# Altium footprint library Amirreza.PcbLib: 524 footprints (part 25 of 33)
Each footprint in its own frame and in the unit in brackets; x right, y up, seen from the top. Pads: shape width x height; smd on the part's side, far side on the other; paste and mask are expansions set on the pad; w line width, h text height; cw(c..) or ccw(c..) is an arc to the next point about the centre after c.
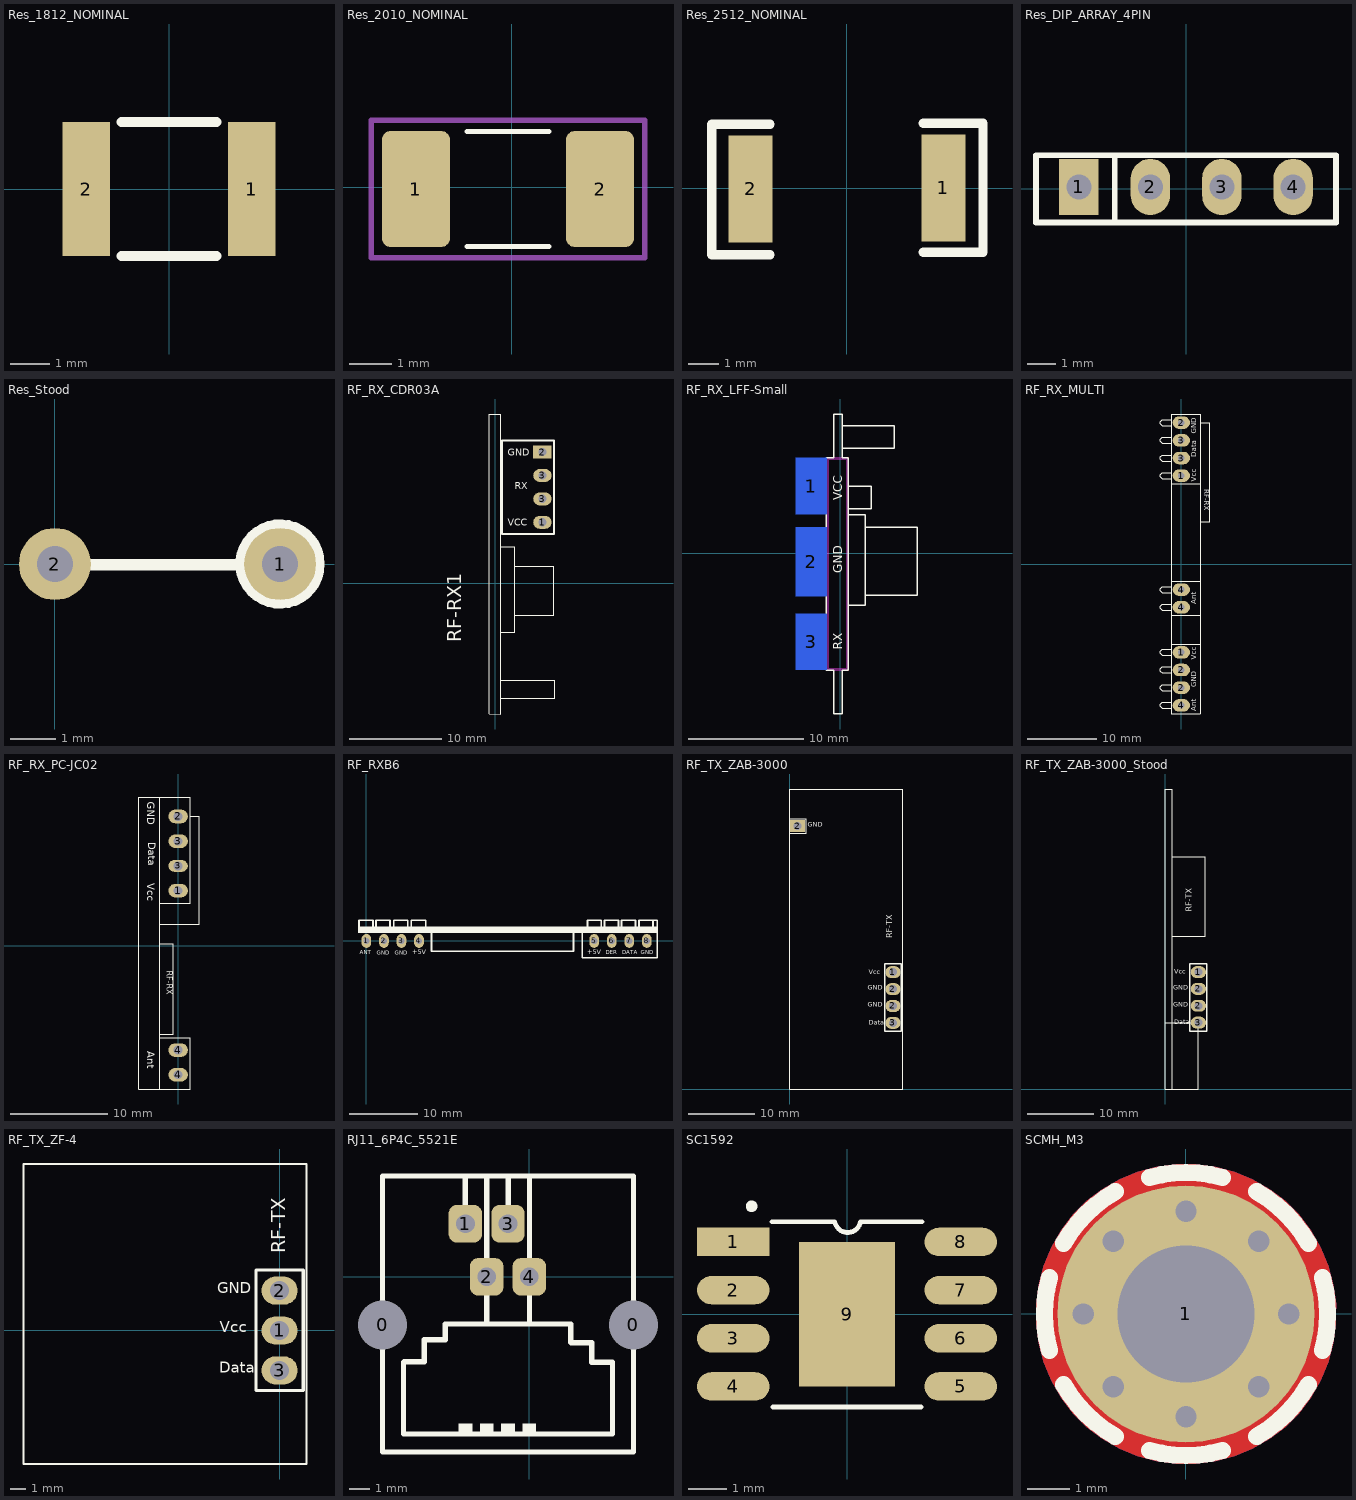
[diagram p24: the footprints below, top view; thin cyan lines are the x and y axes]

## Res_1812_NOMINAL [mm]
pads (2):
  rect 1.2x3.4 smd: 1(2.1,0) 2(-2.1,0)
Top Overlay:
  lines w0.25: -1.2,-1.7 1.2,-1.7 ; -1.2,1.7 1.2,1.7

## Res_2010_NOMINAL [mm]
pads (2):
  rrect25% 1.6x2.72 smd: 1(-2.252,-0.041) 2(2.068,-0.041)
Top Overlay:
  lines w0.127: -1.049,-1.391 0.866,-1.391 ; -1.05,1.309 0.865,1.309
Mechanical 13:
  lines w0.127: -3.302,-1.651 -3.302,1.569 3.118,1.569 3.118,-1.651 -3.302,-1.651
Mechanical 15:
  lines w0.05: -3.302,-1.651 -3.302,1.569 3.118,1.569 3.118,-1.651 -3.302,-1.651
3D body "User Library-R_2010.STEP": height 0.6, standoff 0, extent -2.605,-1.292 2.395,1.208

## Res_2512_NOMINAL [mm]
pads (2):
  rect 1.45x3.5 smd: 1(3.152,0.017) 2(-3.152,-0.017)
Top Overlay:
  lines w0.305: -2.517,-2.167 -4.422,-2.167 -4.422,2.1 -2.517,2.1 ; 2.487,-2.091 4.446,-2.091 4.446,2.125 2.487,2.125
3D body "User Library-res2512_body.step": height 0.64, standoff 0.02, extent -3.159,-1.6 3.16,1.6

## Res_DIP_ARRAY_4PIN [mm]
pads (4):
  rect 1.4x2 hole 0.889: 1(-3.808,0.075)
  oval 1.4x2 hole 0.889: 2(-1.268,0.075) 3(1.272,0.075) 4(3.812,0.075)
Top Overlay:
  lines w0.2: -5.334,-1.195 -5.334,1.194 5.334,1.194 ; -5.334,-1.194 5.334,-1.194 ; -2.54,-1.195 -2.54,1.194 ; 5.334,-1.195 5.334,1.143
3D body "4604x-101-103lf.stp": height 4.25, standoff -4.14, extent -5.055,-1.245 5.055,1.245

## Res_Stood [mm]
pads (2):
  round 1.6 hole 0.8: 1(5.004,0) 2(0,0)
Top Overlay:
  circle w0.254: c5.004,0 r0.866
  lines w0.254: 0.597,-0.018 4.052,-0.018

## RF_RX_CDR03A [mm]
pads (4):
  oval 2x1.4 hole 0.9: 1(5.122,6.622) 3(5.122,9.162) 3(5.122,11.702)
  rect 2x1.4 hole 0.9: 2(5.122,14.242)
Top Overlay:
  lines w0.127: 0.618,-12.439 6.477,-12.439 6.477,-10.502 0.663,-10.502 ; 2.092,1.829 6.325,1.829 6.325,-3.454 2.101,-3.454 ; -0.672,-14.173 0.593,-14.173 0.593,-3.955 0.593,14.536 0.593,18.372 -0.672,18.372 -0.672,-14.173 ; 0.592,-5.309 0.592,3.962 2.092,3.962 2.092,-5.309 0.592,-5.309
  lines w0.2: 6.35,15.512 0.72,15.512 0.72,5.352 6.375,5.352 ; 6.392,5.352 6.392,15.512
  text "RX" at 2.134,10.185 h0.76
  text "GND" at 1.372,13.868 h0.76
  text "VCC" at 1.346,6.248 h0.76
  text "RF-RX1" at -3.708,-6.401 h1.52

## RF_RX_LFF-Small [mm]
pads (3):
  rect 2.7x4.9 smd far side: 1(-2.54,5.842) 3(-2.54,-7.747)
  rect 2.7x6 smd far side: 2(-2.54,-0.762)
Top Overlay:
  lines w0.127: -1.033,8.288 -0.55,8.288 ; -0.042,12.123 0.187,12.123 ; 0.187,9.144 4.699,9.144 4.699,11.08 0.231,11.08 ; 0.695,3.868 2.701,3.868 2.701,5.804 0.739,5.804 ; 2.193,2.243 6.731,2.243 6.731,-3.683 2.202,-3.683 ; -0.55,8.288 -0.55,12.123 0.187,12.123 ; -0.55,8.288 -1.206,8.288 -1.206,-10.203 -0.55,-10.203 -0.55,-14.039 0.187,-14.039 0.187,-10.203 0.695,-10.203 0.695,8.288 ; 0.187,8.288 0.695,8.288 ; 0.187,8.288 0.187,12.123 ; 0.187,8.288 0.695,8.288 ; 0.693,-4.572 2.193,-4.572 2.193,3.334 0.693,3.334 0.693,-4.572
  text "VCC" at 0.178,4.597 h0.76
  text "GND" at 0.178,-1.753 h0.76
  text "RX" at 0.178,-8.433 h0.76
Keep-Out Layer:
  lines w0.254: -1.104,-10.167 -1.104,8.253 0.623,8.253 0.623,-10.167 -1.104,-10.167

## RF_RX_MULTI [mm] "315Mhz Reciever"
pads (10):
  oval 2.5x1.8 hole 0.9 mask+0: 1(0,-12.7) 1(0,12.7) 2(0,-17.78) 2(0,-15.24) 2(0,20.32) 3(0,15.24) 3(0,17.78) 4(0,-20.32) 4(0,-6.22) 4(0,-3.68)
Top Overlay:
  lines w0.127: -1.422,-20.752 -2.711,-20.752 -2.995,-20.467 -2.995,-20.173 -2.711,-19.888 -1.422,-19.886 ; -1.422,-18.212 -2.711,-18.212 -2.995,-17.928 -2.995,-17.633 -2.711,-17.348 -1.422,-17.347 ; -1.422,-15.672 -2.711,-15.672 -2.995,-15.388 -2.995,-15.093 -2.711,-14.808 -1.422,-14.807 ; -1.422,-13.132 -2.711,-13.132 -2.995,-12.848 -2.995,-12.553 -2.711,-12.268 -1.422,-12.267 ; -1.422,-11.52 2.718,-11.52 ; -1.422,-7.4 2.718,-7.4 ; -1.422,-6.652 -2.711,-6.652 -2.995,-6.368 -2.995,-6.073 -2.711,-5.788 -1.422,-5.787 ; -1.422,-4.112 -2.711,-4.112 -2.995,-3.828 -2.995,-3.533 -2.711,-3.248 -1.422,-3.247 ; -1.422,-2.5 2.718,-2.5 ; -1.422,11.52 2.718,11.52 ; -1.422,12.268 -2.711,12.268 -2.995,12.553 -2.995,12.847 -2.711,13.132 -1.422,13.134 ; -1.422,14.808 -2.711,14.808 -2.995,15.093 -2.995,15.387 -2.711,15.672 -1.422,15.674 ; -1.422,17.348 -2.711,17.348 -2.995,17.633 -2.995,17.927 -2.711,18.212 -1.422,18.214 ; -1.422,19.888 -2.711,19.888 -2.995,20.172 -2.995,20.467 -2.711,20.752 -1.422,20.753 ; 2.718,6.1 4.123,6.1 4.123,20.32 2.718,20.32 ; -1.422,-21.5 -1.422,21.5 2.718,21.5 2.718,-21.5 -1.422,-21.5
  text "Ant" at 2.47,-21.209 h1.3
  text "GND" at 2.464,-17.729 h1.3
  text "Vcc" at 2.465,-13.741 h1.3
  text "Ant" at 2.47,-5.816 h1.3
  text "Data" at 2.465,15.342 h1.3
  text "GND" at 2.464,18.745 h1.3
  text "RF-RX" at 3.048,10.77 h1.3
  text "Vcc" at 2.465,11.811 h1.3
3D body "User Library-RF receviver.STEP": height 14.85, standoff -1.55, extent -1.323,-22.86 4.928,22.86

## RF_RX_PC-JC02 [mm] "315Mhz Reciever"
pads (6):
  oval 2x1.4 hole 0.9: 1(0,5.65) 2(0,13.27) 3(0,10.73) 4(0,-13.27) 4(0,-10.73)
  oval 2x1.2 hole 0.9: 3(0,8.19)
Top Overlay:
  lines w0.127: -4.064,-14.73 -4.064,15.27 -1.905,15.27 1.27,15.27 1.27,4.38 -1.905,4.38 ; -4.048,-14.73 1.27,-14.73 1.27,-9.46 -1.905,-9.46 ; -1.905,-14.721 -1.905,15.251 ; -1.905,-9.082 -0.5,-9.082 -0.5,0.189 -1.905,0.189 ; -1.905,2.221 2.19,2.221 2.19,13.27 1.27,13.27
  text "Ant" at -3.429,-10.86 h1.3
  text "Vcc" at -3.429,6.412 h1.3
  text "GND" at -3.429,14.794 h1.3
  text "Data" at -3.302,10.603 h1.3
  text "RF-RX" at -1.397,-2.605 h1
3D body "User Library-pc-jc02RA.STEP": height 12, standoff -5.68, extent -4.349,-15.344 2.571,14.656

## RF_RXB6 [mm]
pads (8):
  oval 1.4x2 hole 0.9: 1(0,0) 2(2.54,0) 3(5.08,0) 4(7.62,0) 5(33.02,0) 6(35.56,0) 7(38.1,0) 8(40.64,0)
Top Overlay:
  rectangle: -1.219,1.168 42.266,2.057
  lines w0.254: -1.092,2.007 -1.092,2.997 0.94,2.997 ; 0.94,2.007 0.94,2.946 ; 1.397,1.905 1.397,2.997 3.429,2.997 3.429,1.88 ; 3.962,1.803 3.962,2.997 5.994,2.997 5.994,1.93 ; 6.502,1.372 6.502,2.997 8.585,2.997 8.585,1.422 ; 32.004,1.905 32.004,2.997 34.036,2.997 34.036,1.88 ; 32.029,1.727 32.029,2.997 33.02,2.997 ; 34.493,1.88 34.493,2.972 ; 34.493,2.997 36.525,2.997 ; 36.525,1.854 36.525,2.972 ; 36.982,1.905 36.982,2.997 39.014,2.997 39.014,1.88 ; 39.497,1.905 39.497,2.997 41.529,2.997 41.529,1.88 ; 41.504,2.997 42.164,2.997 42.164,1.321 ; 9.449,-1.499 9.449,1.346 30.023,1.346 30.023,-1.499 9.449,-1.499 ; 31.293,-2.438 31.293,1.422 42.164,1.422 42.164,-2.438 31.902,-2.438 31.293,-2.438
  text "GND" at 39.751,-2.134 h1
  text "DATA" at 37.059,-2.134 h1
  text "DER" at 34.671,-2.134 h1
  text "+5V" at 32.004,-2.21 h1.2
  text "+5V" at 6.655,-2.235 h1.2
  text "GND" at 4.14,-2.235 h1
  text "GND" at 1.524,-2.21 h1
  text "ANT" at -0.94,-2.184 h1
3D body "User Library-RF receviver.STEP": height 14.7, standoff -1.7, extent -2.54,-4.927 43.18,1.323

## RF_TX_ZAB-3000 [mm]
pads (5):
  oval 2.3x1.8 hole 1.2: 1(15.545,17.551) 2(15.545,12.471) 2(15.545,15.011) 3(15.545,9.931)
  rect 2.3x1.8 hole 1.2: 2(1.2,39.5)
Top Overlay:
  lines w0.127: 0,38.456 2.515,38.456 2.515,40.589 0,40.589 ; 0,0 16.993,0 16.993,45.073 0,45.073 0,0
  lines w0.2: 14.275,8.661 16.815,8.661 16.815,18.821 14.275,18.821 14.275,8.661
  text "RF-TX" at 15.748,22.631 h1.52
  text "GND" at 2.755,39.124 h1.2
  text "Data" at 11.891,9.38 h1.2
  text "GND" at 11.772,14.587 h1.2
  text "Vcc" at 11.891,16.975 h1.2
  text "GND" at 11.772,12.022 h1.2

## RF_TX_ZAB-3000_Stood [mm]
pads (4):
  oval 2.3x1.8 hole 1.2: 1(5,17.62) 2(5,12.54) 2(5,15.08) 3(5,10)
Top Overlay:
  lines w0.127: 0,10 5,10 5,0 1.1,0 ; 1.1,23 6,23 6,35.013 1.1,35.013 ; 1.1,0 0,0 0,45.2 1.1,45.2 1.1,0
  lines w0.2: 3.73,8.73 3.73,18.89 6.27,18.89 6.27,8.73 3.73,8.73
  text "GND" at 1.227,12.09 h1.2
  text "Vcc" at 1.346,17.043 h1.2
  text "GND" at 1.227,14.656 h1.2
  text "Data" at 1.346,9.449 h1.2
  text "RF-TX" at 4.267,26.695 h1.52

## RF_TX_ZF-4 [mm]
pads (3):
  oval 2.3x1.8 hole 1.2: 1(0,0) 2(0,2.54) 3(0,-2.54)
Top Overlay:
  lines w0.127: -16.3,-8.5 1.7,-8.5 1.7,10.6 -16.3,10.6 -16.3,-8.5
  lines w0.2: 1.448,-3.81 -1.5,-3.81 -1.5,3.861 1.448,3.861 ; 1.5,-3.81 1.5,3.861
  text "RF-TX" at 0.686,4.928 h1.52
  text "Data" at -3.861,-2.946 h1.2
  text "Vcc" at -3.81,-0.381 h1.2
  text "GND" at -3.962,2.108 h1.2
3D body "User Library-RF transmitter.step": height 7.5, standoff 0, extent -17.12,-8.459 1.88,10.542

## RJ11_6P4C_5521E [mm]
pads (6):
  round 1.5 hole 2.35: 0(-7.02,-2.3) 0(4.98,-2.3)
  rrect50% 1.6x1.8 hole 0.9: 1(-3.06,2.54) 2(-2.04,0) 3(-1.02,2.54) 4(0,0)
Top Overlay:
  rectangle: -3.39,-7.391 -2.73,-7.01
  rectangle: -1.35,-7.391 -0.69,-7.01
  rectangle: -2.37,-7.391 -1.71,-7.01
  rectangle: -0.33,-7.391 0.33,-7.01
  lines w0.254: -6.02,-4.089 -6.02,-7.518 3.98,-7.518 3.98,-4.089 ; -5.985,-4.055 -5.02,-4.055 -5.02,-3.004 -4.02,-3.004 -4.02,-2.261 1.98,-2.261 1.98,-3.125 ; -3.06,2.54 -3.06,4.826 ; -2.032,-2.187 -2.032,4.826 ; -1.012,2.54 -1.012,4.75 ; 0.008,-2.187 0.008,4.826 ; 2.004,-3.15 2.98,-3.15 2.98,-4.081 3.972,-4.081 ; -7.02,-8.382 -7.02,4.826 4.98,4.826 4.98,-8.382 -7.02,-8.382
3D body "71070898.stp": height 14.75, standoff -3.05, extent -8.444,-8.303 6.323,4.697

## SC1592 [mm]
pads (9):
  rect 1.91x0.75 smd: 1(-3,1.905)
  oval 1.91x0.75 smd: 2(-3,0.635) 3(-3,-0.635) 4(-3,-1.905) 5(3,-1.905) 6(3,-0.635) 7(3,0.635) 8(3,1.905)
  rect 2.54x3.81 smd: 9(0,0)
Top Overlay:
  circle w0.254: c-2.515,2.845 r0.025
  lines w0.127: -1.975,2.438 -0.322,2.438 ccw(c0.017,2.498) 0.356,2.438 1.975,2.438 ; -1.95,-2.45 1.95,-2.45
3D body "CircuitWorks-SO-8.STEP": height 1.45, standoff 0, extent -2.889,-2.464 2.889,2.438

## SCMH_M3 [mm] "SCREW mouting, M3, 3.0mm diameter and 6.0mm PanHead"
pads (1):
  round 6 / inner round 3.5 / far side round 6 hole 3.2 mask+0.1: 1(0,0)
via -1.697,-1.697 diameter 0.8 hole 0.5
via 1.697,1.697 diameter 0.8 hole 0.5
via -2.4,0 diameter 0.8 hole 0.5
via 2.4,0 diameter 0.8 hole 0.5
via -1.697,1.697 diameter 0.8 hole 0.5
via 1.697,-1.697 diameter 0.8 hole 0.5
via 0,-2.4 diameter 0.8 hole 0.5
via 0,2.4 diameter 0.8 hole 0.5
Top Layer:
  pour cut-out: 0,3.5 -0.229,3.5 -0.684,3.44 -1.127,3.321 -1.551,3.146 -1.949,2.916 -2.313,2.637 -2.637,2.313 -2.916,1.949 -3.146,1.551 -3.321,1.127 -3.44,0.684 -3.5,0.229 -3.5,0 -3.5,-0.229 -3.44,-0.684 -3.321,-1.127 -3.146,-1.551 -2.916,-1.949 -2.637,-2.313 -2.313,-2.637 -1.949,-2.916 -1.551,-3.146 -1.127,-3.321 -0.684,-3.44 -0.229,-3.5 0,-3.5 0.229,-3.5 0.684,-3.44 1.127,-3.321 1.551,-3.146 1.949,-2.916 2.313,-2.637 2.637,-2.313 2.916,-1.949 3.146,-1.551 3.321,-1.127 3.44,-0.684 3.5,-0.229 3.5,0 3.5,0.229 3.44,0.684 3.321,1.127 3.146,1.551 2.916,1.949 2.637,2.313 2.313,2.637 1.949,2.916 1.551,3.146 1.127,3.321 0.684,3.44 0.229,3.5
Bottom Layer:
  pour cut-out: 0,3.5 -0.229,3.5 -0.684,3.44 -1.127,3.321 -1.551,3.146 -1.949,2.916 -2.313,2.637 -2.637,2.313 -2.916,1.949 -3.146,1.551 -3.321,1.127 -3.44,0.684 -3.5,0.229 -3.5,0 -3.5,-0.229 -3.44,-0.684 -3.321,-1.127 -3.146,-1.551 -2.916,-1.949 -2.637,-2.313 -2.313,-2.637 -1.949,-2.916 -1.551,-3.146 -1.127,-3.321 -0.684,-3.44 -0.229,-3.5 0,-3.5 0.229,-3.5 0.684,-3.44 1.127,-3.321 1.551,-3.146 1.949,-2.916 2.313,-2.637 2.637,-2.313 2.916,-1.949 3.146,-1.551 3.321,-1.127 3.44,-0.684 3.5,-0.229 3.5,0 3.5,0.229 3.44,0.684 3.321,1.127 3.146,1.551 2.916,1.949 2.637,2.313 2.313,2.637 1.949,2.916 1.551,3.146 1.127,3.321 0.684,3.44 0.229,3.5
Top Overlay:
  lines w0.4: -3.188,-0.854 cw(c0,0) -3.188,0.854 ; -2.858,-1.65 ccw(c0,0) -1.65,-2.858 ; -2.858,1.65 cw(c0,0) -1.65,2.858 ; -0.854,-3.188 ccw(c0,0) 0.854,-3.188 ; -0.854,3.188 cw(c0,0) 0.854,3.188 ; 1.65,-2.858 ccw(c0,0) 2.858,-1.65 ; 1.65,2.858 cw(c0,0) 2.858,1.65 ; 3.188,-0.854 ccw(c0,0) 3.188,0.854